# Altium schematic symbol library jlcpcb_2025_04_resistors_extended_1210.schlib: 2670 symbols (part 2 of 14) (continued)
## 1210W2F2611T5E (continued)

## 1210W2F2700T5E
designator R?  Resistance: 270Ω  (hidden comment: *)
Resistor, 270Ω, ±1%, 500mW, 200V, ±100ppm/℃, -55℃~+155℃, SMD 1210; Manufacturer: Uniroyal; Manufacturer Part Number: 1210W2F2700T5E; Supplier 1: LCSC; Supplier Part Number 1: C620671; JLCPCB Part Number: C620671; Power Rating: 500mW; Category: Resistors; Package Size: 1210; JLCPCB Basic Part: Yes; Tolerance: ±1%; Voltage Rating: 200V; Temperature Coefficient: ±100ppm/℃; Temperature Rating: -55℃~+155℃; ComponentLink1Description: Datasheet; ComponentLink1URL: https://wmsc.lcsc.com/wmsc/upload/file/pdf/v2/lcsc/2205311816_UNI-ROYAL-Uniroyal-Elec-1210W2F2700T5E_C620671.pdf; ComponentLink2Description: JLCPCB Part URL; ComponentLink2URL: https://jlcpcb.com/partdetail/C620671
pins: 1, 2
1 alternate drawing of the same symbol

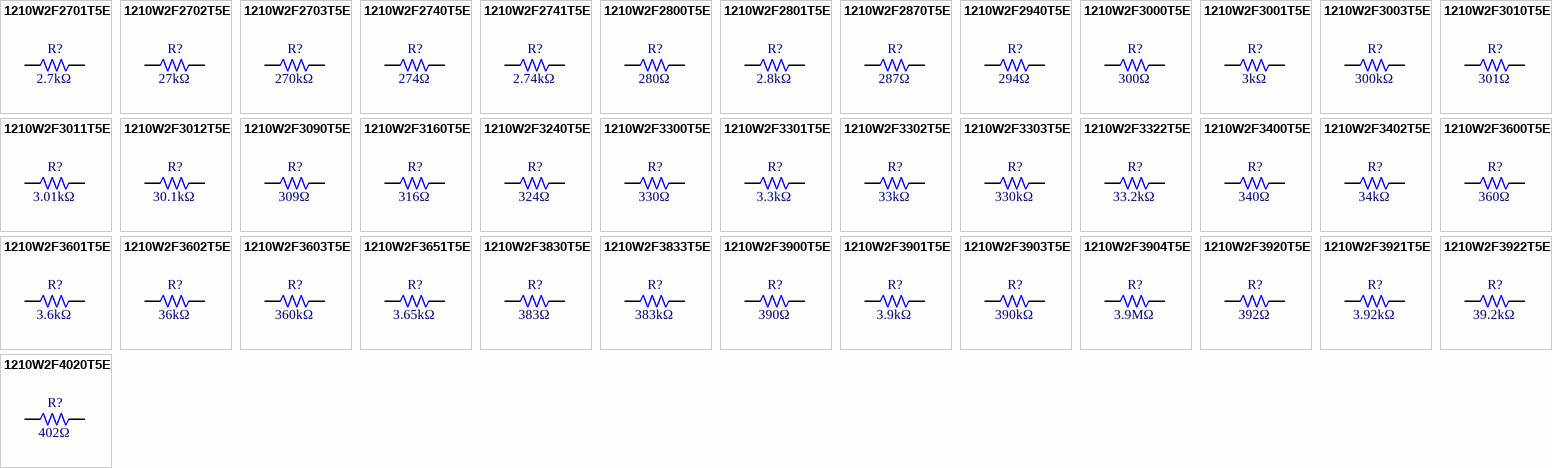
[diagram p6: symbols 1210W2F2701T5E to 1210W2F4020T5E]

## 1210W2F2701T5E
designator R?  Resistance: 2.7kΩ  (hidden comment: *)
Resistor, 2.7kΩ, ±1%, 500mW, 200V, ±100ppm/℃, -55℃~+155℃, SMD 1210; Manufacturer: Uniroyal; Manufacturer Part Number: 1210W2F2701T5E; Supplier 1: LCSC; Supplier Part Number 1: C422342; JLCPCB Part Number: C422342; Power Rating: 500mW; Category: Resistors; Package Size: 1210; JLCPCB Basic Part: Yes; Tolerance: ±1%; Voltage Rating: 200V; Temperature Coefficient: ±100ppm/℃; Temperature Rating: -55℃~+155℃; ComponentLink1Description: Datasheet; ComponentLink1URL: https://wmsc.lcsc.com/wmsc/upload/file/pdf/v2/lcsc/2205312016_UNI-ROYAL-Uniroyal-Elec-1210W2F2701T5E_C422342.pdf; ComponentLink2Description: JLCPCB Part URL; ComponentLink2URL: https://jlcpcb.com/partdetail/C422342
pins: 1, 2
1 alternate drawing of the same symbol

## 1210W2F2702T5E
designator R?  Resistance: 27kΩ  (hidden comment: *)
Resistor, 27kΩ, ±1%, 500mW, 200V, ±100ppm/℃, -55℃~+155℃, SMD 1210; Manufacturer: Uniroyal; Manufacturer Part Number: 1210W2F2702T5E; Supplier 1: LCSC; Supplier Part Number 1: C784290; JLCPCB Part Number: C784290; Power Rating: 500mW; Category: Resistors; Package Size: 1210; JLCPCB Basic Part: Yes; Tolerance: ±1%; Voltage Rating: 200V; Temperature Coefficient: ±100ppm/℃; Temperature Rating: -55℃~+155℃; ComponentLink1Description: Datasheet; ComponentLink1URL: https://wmsc.lcsc.com/wmsc/upload/file/pdf/v2/lcsc/2206011100_UNI-ROYAL-Uniroyal-Elec-1210W2F2702T5E_C784290.pdf; ComponentLink2Description: JLCPCB Part URL; ComponentLink2URL: https://jlcpcb.com/partdetail/C784290
pins: 1, 2
1 alternate drawing of the same symbol

## 1210W2F2703T5E
designator R?  Resistance: 270kΩ  (hidden comment: *)
Resistor, 270kΩ, ±1%, 500mW, 200V, ±100ppm/℃, -55℃~+155℃, SMD 1210; Manufacturer: Uniroyal; Manufacturer Part Number: 1210W2F2703T5E; Supplier 1: LCSC; Supplier Part Number 1: C407199; JLCPCB Part Number: C407199; Power Rating: 500mW; Category: Resistors; Package Size: 1210; JLCPCB Basic Part: Yes; Tolerance: ±1%; Voltage Rating: 200V; Temperature Coefficient: ±100ppm/℃; Temperature Rating: -55℃~+155℃; ComponentLink1Description: Datasheet; ComponentLink1URL: https://wmsc.lcsc.com/wmsc/upload/file/pdf/v2/lcsc/2205311945_UNI-ROYAL-Uniroyal-Elec-1210W2F2703T5E_C407199.pdf; ComponentLink2Description: JLCPCB Part URL; ComponentLink2URL: https://jlcpcb.com/partdetail/C407199
pins: 1, 2
1 alternate drawing of the same symbol

## 1210W2F2740T5E
designator R?  Resistance: 274Ω  (hidden comment: *)
Resistor, 274Ω, ±1%, 500mW, 200V, ±100ppm/℃, -55℃~+155℃, SMD 1210; Manufacturer: Uniroyal; Manufacturer Part Number: 1210W2F2740T5E; Supplier 1: LCSC; Supplier Part Number 1: C784291; JLCPCB Part Number: C784291; Power Rating: 500mW; Category: Resistors; Package Size: 1210; JLCPCB Basic Part: Yes; Tolerance: ±1%; Voltage Rating: 200V; Temperature Coefficient: ±100ppm/℃; Temperature Rating: -55℃~+155℃; ComponentLink1Description: Datasheet; ComponentLink1URL: https://wmsc.lcsc.com/wmsc/upload/file/pdf/v2/lcsc/2206011100_UNI-ROYAL-Uniroyal-Elec-1210W2F2740T5E_C784291.pdf; ComponentLink2Description: JLCPCB Part URL; ComponentLink2URL: https://jlcpcb.com/partdetail/C784291
pins: 1, 2
1 alternate drawing of the same symbol

## 1210W2F2741T5E
designator R?  Resistance: 2.74kΩ  (hidden comment: *)
Resistor, 2.74kΩ, ±1%, 500mW, 200V, ±100ppm/℃, -55℃~+155℃, SMD 1210; Manufacturer: Uniroyal; Manufacturer Part Number: 1210W2F2741T5E; Supplier 1: LCSC; Supplier Part Number 1: C407198; JLCPCB Part Number: C407198; Power Rating: 500mW; Category: Resistors; Package Size: 1210; JLCPCB Basic Part: Yes; Tolerance: ±1%; Voltage Rating: 200V; Temperature Coefficient: ±100ppm/℃; Temperature Rating: -55℃~+155℃; ComponentLink1Description: Datasheet; ComponentLink1URL: https://wmsc.lcsc.com/wmsc/upload/file/pdf/v2/lcsc/2205311945_UNI-ROYAL-Uniroyal-Elec-1210W2F2741T5E_C407198.pdf; ComponentLink2Description: JLCPCB Part URL; ComponentLink2URL: https://jlcpcb.com/partdetail/C407198
pins: 1, 2
1 alternate drawing of the same symbol

## 1210W2F2800T5E
designator R?  Resistance: 280Ω  (hidden comment: *)
Resistor, 280Ω, ±1%, 500mW, 200V, ±100ppm/℃, -55℃~+155℃, SMD 1210; Manufacturer: Uniroyal; Manufacturer Part Number: 1210W2F2800T5E; Supplier 1: LCSC; Supplier Part Number 1: C422339; JLCPCB Part Number: C422339; Power Rating: 500mW; Category: Resistors; Package Size: 1210; JLCPCB Basic Part: Yes; Tolerance: ±1%; Voltage Rating: 200V; Temperature Coefficient: ±100ppm/℃; Temperature Rating: -55℃~+155℃; ComponentLink1Description: Datasheet; ComponentLink1URL: https://wmsc.lcsc.com/wmsc/upload/file/pdf/v2/lcsc/2205312016_UNI-ROYAL-Uniroyal-Elec-1210W2F2800T5E_C422339.pdf; ComponentLink2Description: JLCPCB Part URL; ComponentLink2URL: https://jlcpcb.com/partdetail/C422339
pins: 1, 2
1 alternate drawing of the same symbol

## 1210W2F2801T5E
designator R?  Resistance: 2.8kΩ  (hidden comment: *)
Resistor, 2.8kΩ, ±1%, 500mW, 200V, ±100ppm/℃, -55℃~+155℃, SMD 1210; Manufacturer: Uniroyal; Manufacturer Part Number: 1210W2F2801T5E; Supplier 1: LCSC; Supplier Part Number 1: C422338; JLCPCB Part Number: C422338; Power Rating: 500mW; Category: Resistors; Package Size: 1210; JLCPCB Basic Part: Yes; Tolerance: ±1%; Voltage Rating: 200V; Temperature Coefficient: ±100ppm/℃; Temperature Rating: -55℃~+155℃; ComponentLink1Description: Datasheet; ComponentLink1URL: https://wmsc.lcsc.com/wmsc/upload/file/pdf/v2/lcsc/2205312016_UNI-ROYAL-Uniroyal-Elec-1210W2F2801T5E_C422338.pdf; ComponentLink2Description: JLCPCB Part URL; ComponentLink2URL: https://jlcpcb.com/partdetail/C422338
pins: 1, 2
1 alternate drawing of the same symbol

## 1210W2F2870T5E
designator R?  Resistance: 287Ω  (hidden comment: *)
Resistor, 287Ω, ±1%, 500mW, 200V, ±100ppm/℃, -55℃~+155℃, SMD 1210; Manufacturer: Uniroyal; Manufacturer Part Number: 1210W2F2870T5E; Supplier 1: LCSC; Supplier Part Number 1: C422334; JLCPCB Part Number: C422334; Power Rating: 500mW; Category: Resistors; Package Size: 1210; JLCPCB Basic Part: Yes; Tolerance: ±1%; Voltage Rating: 200V; Temperature Coefficient: ±100ppm/℃; Temperature Rating: -55℃~+155℃; ComponentLink1Description: Datasheet; ComponentLink1URL: https://wmsc.lcsc.com/wmsc/upload/file/pdf/v2/lcsc/2205312016_UNI-ROYAL-Uniroyal-Elec-1210W2F2870T5E_C422334.pdf; ComponentLink2Description: JLCPCB Part URL; ComponentLink2URL: https://jlcpcb.com/partdetail/C422334
pins: 1, 2
1 alternate drawing of the same symbol

## 1210W2F2940T5E
designator R?  Resistance: 294Ω  (hidden comment: *)
Resistor, 294Ω, ±1%, 500mW, 200V, ±100ppm/℃, -55℃~+155℃, SMD 1210; Manufacturer: Uniroyal; Manufacturer Part Number: 1210W2F2940T5E; Supplier 1: LCSC; Supplier Part Number 1: C784292; JLCPCB Part Number: C784292; Power Rating: 500mW; Category: Resistors; Package Size: 1210; JLCPCB Basic Part: Yes; Tolerance: ±1%; Voltage Rating: 200V; Temperature Coefficient: ±100ppm/℃; Temperature Rating: -55℃~+155℃; ComponentLink1Description: Datasheet; ComponentLink1URL: https://wmsc.lcsc.com/wmsc/upload/file/pdf/v2/lcsc/2206011100_UNI-ROYAL-Uniroyal-Elec-1210W2F2940T5E_C784292.pdf; ComponentLink2Description: JLCPCB Part URL; ComponentLink2URL: https://jlcpcb.com/partdetail/C784292
pins: 1, 2
1 alternate drawing of the same symbol

## 1210W2F3000T5E
designator R?  Resistance: 300Ω  (hidden comment: *)
Resistor, 300Ω, ±1%, 500mW, 200V, ±100ppm/℃, -55℃~+155℃, SMD 1210; Manufacturer: Uniroyal; Manufacturer Part Number: 1210W2F3000T5E; Supplier 1: LCSC; Supplier Part Number 1: C407196; JLCPCB Part Number: C407196; Power Rating: 500mW; Category: Resistors; Package Size: 1210; JLCPCB Basic Part: Yes; Tolerance: ±1%; Voltage Rating: 200V; Temperature Coefficient: ±100ppm/℃; Temperature Rating: -55℃~+155℃; ComponentLink1Description: Datasheet; ComponentLink1URL: https://wmsc.lcsc.com/wmsc/upload/file/pdf/v2/lcsc/2205311945_UNI-ROYAL-Uniroyal-Elec-1210W2F3000T5E_C407196.pdf; ComponentLink2Description: JLCPCB Part URL; ComponentLink2URL: https://jlcpcb.com/partdetail/C407196
pins: 1, 2
1 alternate drawing of the same symbol

## 1210W2F3001T5E
designator R?  Resistance: 3kΩ  (hidden comment: *)
Resistor, 3kΩ, ±1%, 500mW, 200V, ±100ppm/℃, -55℃~+155℃, SMD 1210; Manufacturer: Uniroyal; Manufacturer Part Number: 1210W2F3001T5E; Supplier 1: LCSC; Supplier Part Number 1: C422332; JLCPCB Part Number: C422332; Power Rating: 500mW; Category: Resistors; Package Size: 1210; JLCPCB Basic Part: Yes; Tolerance: ±1%; Voltage Rating: 200V; Temperature Coefficient: ±100ppm/℃; Temperature Rating: -55℃~+155℃; ComponentLink1Description: Datasheet; ComponentLink1URL: https://wmsc.lcsc.com/wmsc/upload/file/pdf/v2/lcsc/2205312016_UNI-ROYAL-Uniroyal-Elec-1210W2F3001T5E_C422332.pdf; ComponentLink2Description: JLCPCB Part URL; ComponentLink2URL: https://jlcpcb.com/partdetail/C422332
pins: 1, 2
1 alternate drawing of the same symbol

## 1210W2F3003T5E
designator R?  Resistance: 300kΩ  (hidden comment: *)
Resistor, 300kΩ, ±1%, 500mW, 200V, ±100ppm/℃, -55℃~+155℃, SMD 1210; Manufacturer: Uniroyal; Manufacturer Part Number: 1210W2F3003T5E; Supplier 1: LCSC; Supplier Part Number 1: C422330; JLCPCB Part Number: C422330; Power Rating: 500mW; Category: Resistors; Package Size: 1210; JLCPCB Basic Part: Yes; Tolerance: ±1%; Voltage Rating: 200V; Temperature Coefficient: ±100ppm/℃; Temperature Rating: -55℃~+155℃; ComponentLink1Description: Datasheet; ComponentLink1URL: https://wmsc.lcsc.com/wmsc/upload/file/pdf/v2/lcsc/2205312016_UNI-ROYAL-Uniroyal-Elec-1210W2F3003T5E_C422330.pdf; ComponentLink2Description: JLCPCB Part URL; ComponentLink2URL: https://jlcpcb.com/partdetail/C422330
pins: 1, 2
1 alternate drawing of the same symbol

## 1210W2F3010T5E
designator R?  Resistance: 301Ω  (hidden comment: *)
Resistor, 301Ω, ±1%, 500mW, 200V, ±100ppm/℃, -55℃~+155℃, SMD 1210; Manufacturer: Uniroyal; Manufacturer Part Number: 1210W2F3010T5E; Supplier 1: LCSC; Supplier Part Number 1: C784293; JLCPCB Part Number: C784293; Power Rating: 500mW; Category: Resistors; Package Size: 1210; JLCPCB Basic Part: Yes; Tolerance: ±1%; Voltage Rating: 200V; Temperature Coefficient: ±100ppm/℃; Temperature Rating: -55℃~+155℃; ComponentLink1Description: Datasheet; ComponentLink1URL: https://wmsc.lcsc.com/wmsc/upload/file/pdf/v2/lcsc/2206011100_UNI-ROYAL-Uniroyal-Elec-1210W2F3010T5E_C784293.pdf; ComponentLink2Description: JLCPCB Part URL; ComponentLink2URL: https://jlcpcb.com/partdetail/C784293
pins: 1, 2
1 alternate drawing of the same symbol

## 1210W2F3011T5E
designator R?  Resistance: 3.01kΩ  (hidden comment: *)
Resistor, 3.01kΩ, ±1%, 500mW, 200V, ±100ppm/℃, -55℃~+155℃, SMD 1210; Manufacturer: Uniroyal; Manufacturer Part Number: 1210W2F3011T5E; Supplier 1: LCSC; Supplier Part Number 1: C47115; JLCPCB Part Number: C47115; Power Rating: 500mW; Category: Resistors; Package Size: 1210; JLCPCB Basic Part: Yes; Tolerance: ±1%; Voltage Rating: 200V; Temperature Coefficient: ±100ppm/℃; Temperature Rating: -55℃~+155℃; ComponentLink1Description: Datasheet; ComponentLink1URL: https://wmsc.lcsc.com/wmsc/upload/file/pdf/v2/lcsc/2206010000_UNI-ROYAL-Uniroyal-Elec-1210W2F3011T5E_C47115.pdf; ComponentLink2Description: JLCPCB Part URL; ComponentLink2URL: https://jlcpcb.com/partdetail/C47115
pins: 1, 2
1 alternate drawing of the same symbol

## 1210W2F3012T5E
designator R?  Resistance: 30.1kΩ  (hidden comment: *)
Resistor, 30.1kΩ, ±1%, 500mW, 200V, ±100ppm/℃, -55℃~+155℃, SMD 1210; Manufacturer: Uniroyal; Manufacturer Part Number: 1210W2F3012T5E; Supplier 1: LCSC; Supplier Part Number 1: C422329; JLCPCB Part Number: C422329; Power Rating: 500mW; Category: Resistors; Package Size: 1210; JLCPCB Basic Part: Yes; Tolerance: ±1%; Voltage Rating: 200V; Temperature Coefficient: ±100ppm/℃; Temperature Rating: -55℃~+155℃; ComponentLink1Description: Datasheet; ComponentLink1URL: https://wmsc.lcsc.com/wmsc/upload/file/pdf/v2/lcsc/2205312016_UNI-ROYAL-Uniroyal-Elec-1210W2F3012T5E_C422329.pdf; ComponentLink2Description: JLCPCB Part URL; ComponentLink2URL: https://jlcpcb.com/partdetail/C422329
pins: 1, 2
1 alternate drawing of the same symbol

## 1210W2F3090T5E
designator R?  Resistance: 309Ω  (hidden comment: *)
Resistor, 309Ω, ±1%, 500mW, 200V, ±100ppm/℃, -55℃~+155℃, SMD 1210; Manufacturer: Uniroyal; Manufacturer Part Number: 1210W2F3090T5E; Supplier 1: LCSC; Supplier Part Number 1: C784294; JLCPCB Part Number: C784294; Power Rating: 500mW; Category: Resistors; Package Size: 1210; JLCPCB Basic Part: Yes; Tolerance: ±1%; Voltage Rating: 200V; Temperature Coefficient: ±100ppm/℃; Temperature Rating: -55℃~+155℃; ComponentLink1Description: Datasheet; ComponentLink1URL: https://wmsc.lcsc.com/wmsc/upload/file/pdf/v2/lcsc/2206011100_UNI-ROYAL-Uniroyal-Elec-1210W2F3090T5E_C784294.pdf; ComponentLink2Description: JLCPCB Part URL; ComponentLink2URL: https://jlcpcb.com/partdetail/C784294
pins: 1, 2
1 alternate drawing of the same symbol

## 1210W2F3160T5E
designator R?  Resistance: 316Ω  (hidden comment: *)
Resistor, 316Ω, ±1%, 500mW, 200V, ±100ppm/℃, -55℃~+155℃, SMD 1210; Manufacturer: Uniroyal; Manufacturer Part Number: 1210W2F3160T5E; Supplier 1: LCSC; Supplier Part Number 1: C784295; JLCPCB Part Number: C784295; Power Rating: 500mW; Category: Resistors; Package Size: 1210; JLCPCB Basic Part: Yes; Tolerance: ±1%; Voltage Rating: 200V; Temperature Coefficient: ±100ppm/℃; Temperature Rating: -55℃~+155℃; ComponentLink1Description: Datasheet; ComponentLink1URL: https://wmsc.lcsc.com/wmsc/upload/file/pdf/v2/lcsc/2206011100_UNI-ROYAL-Uniroyal-Elec-1210W2F3160T5E_C784295.pdf; ComponentLink2Description: JLCPCB Part URL; ComponentLink2URL: https://jlcpcb.com/partdetail/C784295
pins: 1, 2
1 alternate drawing of the same symbol

## 1210W2F3240T5E
designator R?  Resistance: 324Ω  (hidden comment: *)
Resistor, 324Ω, ±1%, 500mW, 200V, ±100ppm/℃, -55℃~+155℃, SMD 1210; Manufacturer: Uniroyal; Manufacturer Part Number: 1210W2F3240T5E; Supplier 1: LCSC; Supplier Part Number 1: C407194; JLCPCB Part Number: C407194; Power Rating: 500mW; Category: Resistors; Package Size: 1210; JLCPCB Basic Part: Yes; Tolerance: ±1%; Voltage Rating: 200V; Temperature Coefficient: ±100ppm/℃; Temperature Rating: -55℃~+155℃; ComponentLink1Description: Datasheet; ComponentLink1URL: https://wmsc.lcsc.com/wmsc/upload/file/pdf/v2/lcsc/2205311945_UNI-ROYAL-Uniroyal-Elec-1210W2F3240T5E_C407194.pdf; ComponentLink2Description: JLCPCB Part URL; ComponentLink2URL: https://jlcpcb.com/partdetail/C407194
pins: 1, 2
1 alternate drawing of the same symbol

## 1210W2F3300T5E
designator R?  Resistance: 330Ω  (hidden comment: *)
Resistor, 330Ω, ±1%, 500mW, 200V, ±100ppm/℃, -55℃~+155℃, SMD 1210; Manufacturer: Uniroyal; Manufacturer Part Number: 1210W2F3300T5E; Supplier 1: LCSC; Supplier Part Number 1: C422327; JLCPCB Part Number: C422327; Power Rating: 500mW; Category: Resistors; Package Size: 1210; JLCPCB Basic Part: Yes; Tolerance: ±1%; Voltage Rating: 200V; Temperature Coefficient: ±100ppm/℃; Temperature Rating: -55℃~+155℃; ComponentLink1Description: Datasheet; ComponentLink1URL: https://wmsc.lcsc.com/wmsc/upload/file/pdf/v2/lcsc/2205312016_UNI-ROYAL-Uniroyal-Elec-1210W2F3300T5E_C422327.pdf; ComponentLink2Description: JLCPCB Part URL; ComponentLink2URL: https://jlcpcb.com/partdetail/C422327
pins: 1, 2
1 alternate drawing of the same symbol

## 1210W2F3301T5E
designator R?  Resistance: 3.3kΩ  (hidden comment: *)
Resistor, 3.3kΩ, ±1%, 500mW, 200V, ±100ppm/℃, -55℃~+155℃, SMD 1210; Manufacturer: Uniroyal; Manufacturer Part Number: 1210W2F3301T5E; Supplier 1: LCSC; Supplier Part Number 1: C474221; JLCPCB Part Number: C474221; Power Rating: 500mW; Category: Resistors; Package Size: 1210; JLCPCB Basic Part: Yes; Tolerance: ±1%; Voltage Rating: 200V; Temperature Coefficient: ±100ppm/℃; Temperature Rating: -55℃~+155℃; ComponentLink1Description: Datasheet; ComponentLink1URL: https://wmsc.lcsc.com/wmsc/upload/file/pdf/v2/lcsc/2206011100_UNI-ROYAL-Uniroyal-Elec-1210W2F3301T5E_C474221.pdf; ComponentLink2Description: JLCPCB Part URL; ComponentLink2URL: https://jlcpcb.com/partdetail/C474221
pins: 1, 2
1 alternate drawing of the same symbol

## 1210W2F3302T5E
designator R?  Resistance: 33kΩ  (hidden comment: *)
Resistor, 33kΩ, ±1%, 500mW, 200V, ±100ppm/℃, -55℃~+155℃, SMD 1210; Manufacturer: Uniroyal; Manufacturer Part Number: 1210W2F3302T5E; Supplier 1: LCSC; Supplier Part Number 1: C270890; JLCPCB Part Number: C270890; Power Rating: 500mW; Category: Resistors; Package Size: 1210; JLCPCB Basic Part: Yes; Tolerance: ±1%; Voltage Rating: 200V; Temperature Coefficient: ±100ppm/℃; Temperature Rating: -55℃~+155℃; ComponentLink1Description: Datasheet; ComponentLink1URL: https://wmsc.lcsc.com/wmsc/upload/file/pdf/v2/lcsc/2205312300_UNI-ROYAL-Uniroyal-Elec-1210W2F3302T5E_C270890.pdf; ComponentLink2Description: JLCPCB Part URL; ComponentLink2URL: https://jlcpcb.com/partdetail/C270890
pins: 1, 2
1 alternate drawing of the same symbol

## 1210W2F3303T5E
designator R?  Resistance: 330kΩ  (hidden comment: *)
Resistor, 330kΩ, ±1%, 500mW, 200V, ±100ppm/℃, -55℃~+155℃, SMD 1210; Manufacturer: Uniroyal; Manufacturer Part Number: 1210W2F3303T5E; Supplier 1: LCSC; Supplier Part Number 1: C407193; JLCPCB Part Number: C407193; Power Rating: 500mW; Category: Resistors; Package Size: 1210; JLCPCB Basic Part: Yes; Tolerance: ±1%; Voltage Rating: 200V; Temperature Coefficient: ±100ppm/℃; Temperature Rating: -55℃~+155℃; ComponentLink1Description: Datasheet; ComponentLink1URL: https://wmsc.lcsc.com/wmsc/upload/file/pdf/v2/lcsc/2205311945_UNI-ROYAL-Uniroyal-Elec-1210W2F3303T5E_C407193.pdf; ComponentLink2Description: JLCPCB Part URL; ComponentLink2URL: https://jlcpcb.com/partdetail/C407193
pins: 1, 2
1 alternate drawing of the same symbol

## 1210W2F3322T5E
designator R?  Resistance: 33.2kΩ  (hidden comment: *)
Resistor, 33.2kΩ, ±1%, 500mW, 200V, ±100ppm/℃, -55℃~+155℃, SMD 1210; Manufacturer: Uniroyal; Manufacturer Part Number: 1210W2F3322T5E; Supplier 1: LCSC; Supplier Part Number 1: C422325; JLCPCB Part Number: C422325; Power Rating: 500mW; Category: Resistors; Package Size: 1210; JLCPCB Basic Part: Yes; Tolerance: ±1%; Voltage Rating: 200V; Temperature Coefficient: ±100ppm/℃; Temperature Rating: -55℃~+155℃; ComponentLink1Description: Datasheet; ComponentLink1URL: https://wmsc.lcsc.com/wmsc/upload/file/pdf/v2/lcsc/2205312016_UNI-ROYAL-Uniroyal-Elec-1210W2F3322T5E_C422325.pdf; ComponentLink2Description: JLCPCB Part URL; ComponentLink2URL: https://jlcpcb.com/partdetail/C422325
pins: 1, 2
1 alternate drawing of the same symbol

## 1210W2F3400T5E
designator R?  Resistance: 340Ω  (hidden comment: *)
Resistor, 340Ω, ±1%, 500mW, 200V, ±100ppm/℃, -55℃~+155℃, SMD 1210; Manufacturer: Uniroyal; Manufacturer Part Number: 1210W2F3400T5E; Supplier 1: LCSC; Supplier Part Number 1: C784296; JLCPCB Part Number: C784296; Power Rating: 500mW; Category: Resistors; Package Size: 1210; JLCPCB Basic Part: Yes; Tolerance: ±1%; Voltage Rating: 200V; Temperature Coefficient: ±100ppm/℃; Temperature Rating: -55℃~+155℃; ComponentLink1Description: Datasheet; ComponentLink1URL: https://wmsc.lcsc.com/wmsc/upload/file/pdf/v2/lcsc/2206011100_UNI-ROYAL-Uniroyal-Elec-1210W2F3400T5E_C784296.pdf; ComponentLink2Description: JLCPCB Part URL; ComponentLink2URL: https://jlcpcb.com/partdetail/C784296
pins: 1, 2
1 alternate drawing of the same symbol

## 1210W2F3402T5E
designator R?  Resistance: 34kΩ  (hidden comment: *)
Resistor, 34kΩ, ±1%, 500mW, 200V, ±100ppm/℃, -55℃~+155℃, SMD 1210; Manufacturer: Uniroyal; Manufacturer Part Number: 1210W2F3402T5E; Supplier 1: LCSC; Supplier Part Number 1: C407191; JLCPCB Part Number: C407191; Power Rating: 500mW; Category: Resistors; Package Size: 1210; JLCPCB Basic Part: Yes; Tolerance: ±1%; Voltage Rating: 200V; Temperature Coefficient: ±100ppm/℃; Temperature Rating: -55℃~+155℃; ComponentLink1Description: Datasheet; ComponentLink1URL: https://wmsc.lcsc.com/wmsc/upload/file/pdf/v2/lcsc/2205311945_UNI-ROYAL-Uniroyal-Elec-1210W2F3402T5E_C407191.pdf; ComponentLink2Description: JLCPCB Part URL; ComponentLink2URL: https://jlcpcb.com/partdetail/C407191
pins: 1, 2
1 alternate drawing of the same symbol

## 1210W2F3600T5E
designator R?  Resistance: 360Ω  (hidden comment: *)
Resistor, 360Ω, ±1%, 500mW, 200V, ±100ppm/℃, -55℃~+155℃, SMD 1210; Manufacturer: Uniroyal; Manufacturer Part Number: 1210W2F3600T5E; Supplier 1: LCSC; Supplier Part Number 1: C620680; JLCPCB Part Number: C620680; Power Rating: 500mW; Category: Resistors; Package Size: 1210; JLCPCB Basic Part: Yes; Tolerance: ±1%; Voltage Rating: 200V; Temperature Coefficient: ±100ppm/℃; Temperature Rating: -55℃~+155℃; ComponentLink1Description: Datasheet; ComponentLink1URL: https://wmsc.lcsc.com/wmsc/upload/file/pdf/v2/lcsc/2205311816_UNI-ROYAL-Uniroyal-Elec-1210W2F3600T5E_C620680.pdf; ComponentLink2Description: JLCPCB Part URL; ComponentLink2URL: https://jlcpcb.com/partdetail/C620680
pins: 1, 2
1 alternate drawing of the same symbol

## 1210W2F3601T5E
designator R?  Resistance: 3.6kΩ  (hidden comment: *)
Resistor, 3.6kΩ, ±1%, 500mW, 200V, ±100ppm/℃, -55℃~+155℃, SMD 1210; Manufacturer: Uniroyal; Manufacturer Part Number: 1210W2F3601T5E; Supplier 1: LCSC; Supplier Part Number 1: C65411; JLCPCB Part Number: C65411; Power Rating: 500mW; Category: Resistors; Package Size: 1210; JLCPCB Basic Part: Yes; Tolerance: ±1%; Voltage Rating: 200V; Temperature Coefficient: ±100ppm/℃; Temperature Rating: -55℃~+155℃; ComponentLink1Description: Datasheet; ComponentLink1URL: https://wmsc.lcsc.com/wmsc/upload/file/pdf/v2/lcsc/2205312345_UNI-ROYAL-Uniroyal-Elec-1210W2F3601T5E_C65411.pdf; ComponentLink2Description: JLCPCB Part URL; ComponentLink2URL: https://jlcpcb.com/partdetail/C65411
pins: 1, 2
1 alternate drawing of the same symbol

## 1210W2F3602T5E
designator R?  Resistance: 36kΩ  (hidden comment: *)
Resistor, 36kΩ, ±1%, 500mW, 200V, ±100ppm/℃, -55℃~+155℃, SMD 1210; Manufacturer: Uniroyal; Manufacturer Part Number: 1210W2F3602T5E; Supplier 1: LCSC; Supplier Part Number 1: C407189; JLCPCB Part Number: C407189; Power Rating: 500mW; Category: Resistors; Package Size: 1210; JLCPCB Basic Part: Yes; Tolerance: ±1%; Voltage Rating: 200V; Temperature Coefficient: ±100ppm/℃; Temperature Rating: -55℃~+155℃; ComponentLink1Description: Datasheet; ComponentLink1URL: https://wmsc.lcsc.com/wmsc/upload/file/pdf/v2/lcsc/2205311945_UNI-ROYAL-Uniroyal-Elec-1210W2F3602T5E_C407189.pdf; ComponentLink2Description: JLCPCB Part URL; ComponentLink2URL: https://jlcpcb.com/partdetail/C407189
pins: 1, 2
1 alternate drawing of the same symbol

## 1210W2F3603T5E
designator R?  Resistance: 360kΩ  (hidden comment: *)
Resistor, 360kΩ, ±1%, 500mW, 200V, ±100ppm/℃, -55℃~+155℃, SMD 1210; Manufacturer: Uniroyal; Manufacturer Part Number: 1210W2F3603T5E; Supplier 1: LCSC; Supplier Part Number 1: C407188; JLCPCB Part Number: C407188; Power Rating: 500mW; Category: Resistors; Package Size: 1210; JLCPCB Basic Part: Yes; Tolerance: ±1%; Voltage Rating: 200V; Temperature Coefficient: ±100ppm/℃; Temperature Rating: -55℃~+155℃; ComponentLink1Description: Datasheet; ComponentLink1URL: https://wmsc.lcsc.com/wmsc/upload/file/pdf/v2/lcsc/2205311945_UNI-ROYAL-Uniroyal-Elec-1210W2F3603T5E_C407188.pdf; ComponentLink2Description: JLCPCB Part URL; ComponentLink2URL: https://jlcpcb.com/partdetail/C407188
pins: 1, 2
1 alternate drawing of the same symbol

## 1210W2F3651T5E
designator R?  Resistance: 3.65kΩ  (hidden comment: *)
Resistor, 3.65kΩ, ±1%, 500mW, 200V, ±100ppm/℃, -55℃~+155℃, SMD 1210; Manufacturer: Uniroyal; Manufacturer Part Number: 1210W2F3651T5E; Supplier 1: LCSC; Supplier Part Number 1: C407187; JLCPCB Part Number: C407187; Power Rating: 500mW; Category: Resistors; Package Size: 1210; JLCPCB Basic Part: Yes; Tolerance: ±1%; Voltage Rating: 200V; Temperature Coefficient: ±100ppm/℃; Temperature Rating: -55℃~+155℃; ComponentLink1Description: Datasheet; ComponentLink1URL: https://wmsc.lcsc.com/wmsc/upload/file/pdf/v2/lcsc/2205312300_UNI-ROYAL-Uniroyal-Elec-1210W2F3651T5E_C407187.pdf; ComponentLink2Description: JLCPCB Part URL; ComponentLink2URL: https://jlcpcb.com/partdetail/C407187
pins: 1, 2
1 alternate drawing of the same symbol

## 1210W2F3830T5E
designator R?  Resistance: 383Ω  (hidden comment: *)
Resistor, 383Ω, ±1%, 500mW, 200V, ±100ppm/℃, -55℃~+155℃, SMD 1210; Manufacturer: Uniroyal; Manufacturer Part Number: 1210W2F3830T5E; Supplier 1: LCSC; Supplier Part Number 1: C422314; JLCPCB Part Number: C422314; Power Rating: 500mW; Category: Resistors; Package Size: 1210; JLCPCB Basic Part: Yes; Tolerance: ±1%; Voltage Rating: 200V; Temperature Coefficient: ±100ppm/℃; Temperature Rating: -55℃~+155℃; ComponentLink1Description: Datasheet; ComponentLink1URL: https://wmsc.lcsc.com/wmsc/upload/file/pdf/v2/lcsc/2205312016_UNI-ROYAL-Uniroyal-Elec-1210W2F3830T5E_C422314.pdf; ComponentLink2Description: JLCPCB Part URL; ComponentLink2URL: https://jlcpcb.com/partdetail/C422314
pins: 1, 2
1 alternate drawing of the same symbol

## 1210W2F3833T5E
designator R?  Resistance: 383kΩ  (hidden comment: *)
Resistor, 383kΩ, ±1%, 500mW, 200V, ±100ppm/℃, -55℃~+155℃, SMD 1210; Manufacturer: Uniroyal; Manufacturer Part Number: 1210W2F3833T5E; Supplier 1: LCSC; Supplier Part Number 1: C422312; JLCPCB Part Number: C422312; Power Rating: 500mW; Category: Resistors; Package Size: 1210; JLCPCB Basic Part: Yes; Tolerance: ±1%; Voltage Rating: 200V; Temperature Coefficient: ±100ppm/℃; Temperature Rating: -55℃~+155℃; ComponentLink1Description: Datasheet; ComponentLink1URL: https://wmsc.lcsc.com/wmsc/upload/file/pdf/v2/lcsc/2205312016_UNI-ROYAL-Uniroyal-Elec-1210W2F3833T5E_C422312.pdf; ComponentLink2Description: JLCPCB Part URL; ComponentLink2URL: https://jlcpcb.com/partdetail/C422312
pins: 1, 2
1 alternate drawing of the same symbol

## 1210W2F3900T5E
designator R?  Resistance: 390Ω  (hidden comment: *)
Resistor, 390Ω, ±1%, 500mW, 200V, ±100ppm/℃, -55℃~+155℃, SMD 1210; Manufacturer: Uniroyal; Manufacturer Part Number: 1210W2F3900T5E; Supplier 1: LCSC; Supplier Part Number 1: C122364; JLCPCB Part Number: C122364; Power Rating: 500mW; Category: Resistors; Package Size: 1210; JLCPCB Basic Part: Yes; Tolerance: ±1%; Voltage Rating: 200V; Temperature Coefficient: ±100ppm/℃; Temperature Rating: -55℃~+155℃; ComponentLink1Description: Datasheet; ComponentLink1URL: https://wmsc.lcsc.com/wmsc/upload/file/pdf/v2/lcsc/2205312316_UNI-ROYAL-Uniroyal-Elec-1210W2F3900T5E_C122364.pdf; ComponentLink2Description: JLCPCB Part URL; ComponentLink2URL: https://jlcpcb.com/partdetail/C122364
pins: 1, 2
1 alternate drawing of the same symbol

## 1210W2F3901T5E
designator R?  Resistance: 3.9kΩ  (hidden comment: *)
Resistor, 3.9kΩ, ±1%, 500mW, 200V, ±100ppm/℃, -55℃~+155℃, SMD 1210; Manufacturer: Uniroyal; Manufacturer Part Number: 1210W2F3901T5E; Supplier 1: LCSC; Supplier Part Number 1: C620677; JLCPCB Part Number: C620677; Power Rating: 500mW; Category: Resistors; Package Size: 1210; JLCPCB Basic Part: Yes; Tolerance: ±1%; Voltage Rating: 200V; Temperature Coefficient: ±100ppm/℃; Temperature Rating: -55℃~+155℃; ComponentLink1Description: Datasheet; ComponentLink1URL: https://wmsc.lcsc.com/wmsc/upload/file/pdf/v2/lcsc/2205311816_UNI-ROYAL-Uniroyal-Elec-1210W2F3901T5E_C620677.pdf; ComponentLink2Description: JLCPCB Part URL; ComponentLink2URL: https://jlcpcb.com/partdetail/C620677
pins: 1, 2
1 alternate drawing of the same symbol

## 1210W2F3903T5E
designator R?  Resistance: 390kΩ  (hidden comment: *)
Resistor, 390kΩ, ±1%, 500mW, 200V, ±100ppm/℃, -55℃~+155℃, SMD 1210; Manufacturer: Uniroyal; Manufacturer Part Number: 1210W2F3903T5E; Supplier 1: LCSC; Supplier Part Number 1: C422311; JLCPCB Part Number: C422311; Power Rating: 500mW; Category: Resistors; Package Size: 1210; JLCPCB Basic Part: Yes; Tolerance: ±1%; Voltage Rating: 200V; Temperature Coefficient: ±100ppm/℃; Temperature Rating: -55℃~+155℃; ComponentLink1Description: Datasheet; ComponentLink1URL: https://wmsc.lcsc.com/wmsc/upload/file/pdf/v2/lcsc/2205312016_UNI-ROYAL-Uniroyal-Elec-1210W2F3903T5E_C422311.pdf; ComponentLink2Description: JLCPCB Part URL; ComponentLink2URL: https://jlcpcb.com/partdetail/C422311
pins: 1, 2
1 alternate drawing of the same symbol

## 1210W2F3904T5E
designator R?  Resistance: 3.9MΩ  (hidden comment: *)
Resistor, 3.9MΩ, ±1%, 500mW, 200V, ±100ppm/℃, -55℃~+155℃, SMD 1210; Manufacturer: Uniroyal; Manufacturer Part Number: 1210W2F3904T5E; Supplier 1: LCSC; Supplier Part Number 1: C407185; JLCPCB Part Number: C407185; Power Rating: 500mW; Category: Resistors; Package Size: 1210; JLCPCB Basic Part: Yes; Tolerance: ±1%; Voltage Rating: 200V; Temperature Coefficient: ±100ppm/℃; Temperature Rating: -55℃~+155℃; ComponentLink1Description: Datasheet; ComponentLink1URL: https://wmsc.lcsc.com/wmsc/upload/file/pdf/v2/lcsc/2205312300_UNI-ROYAL-Uniroyal-Elec-1210W2F3904T5E_C407185.pdf; ComponentLink2Description: JLCPCB Part URL; ComponentLink2URL: https://jlcpcb.com/partdetail/C407185
pins: 1, 2
1 alternate drawing of the same symbol

## 1210W2F3920T5E
designator R?  Resistance: 392Ω  (hidden comment: *)
Resistor, 392Ω, ±1%, 500mW, 200V, ±100ppm/℃, -55℃~+155℃, SMD 1210; Manufacturer: Uniroyal; Manufacturer Part Number: 1210W2F3920T5E; Supplier 1: LCSC; Supplier Part Number 1: C407184; JLCPCB Part Number: C407184; Power Rating: 500mW; Category: Resistors; Package Size: 1210; JLCPCB Basic Part: Yes; Tolerance: ±1%; Voltage Rating: 200V; Temperature Coefficient: ±100ppm/℃; Temperature Rating: -55℃~+155℃; ComponentLink1Description: Datasheet; ComponentLink1URL: https://wmsc.lcsc.com/wmsc/upload/file/pdf/v2/lcsc/2205312300_UNI-ROYAL-Uniroyal-Elec-1210W2F3920T5E_C407184.pdf; ComponentLink2Description: JLCPCB Part URL; ComponentLink2URL: https://jlcpcb.com/partdetail/C407184
pins: 1, 2
1 alternate drawing of the same symbol

## 1210W2F3921T5E
designator R?  Resistance: 3.92kΩ  (hidden comment: *)
Resistor, 3.92kΩ, ±1%, 500mW, 200V, ±100ppm/℃, -55℃~+155℃, SMD 1210; Manufacturer: Uniroyal; Manufacturer Part Number: 1210W2F3921T5E; Supplier 1: LCSC; Supplier Part Number 1: C422309; JLCPCB Part Number: C422309; Power Rating: 500mW; Category: Resistors; Package Size: 1210; JLCPCB Basic Part: Yes; Tolerance: ±1%; Voltage Rating: 200V; Temperature Coefficient: ±100ppm/℃; Temperature Rating: -55℃~+155℃; ComponentLink1Description: Datasheet; ComponentLink1URL: https://wmsc.lcsc.com/wmsc/upload/file/pdf/v2/lcsc/2205312016_UNI-ROYAL-Uniroyal-Elec-1210W2F3921T5E_C422309.pdf; ComponentLink2Description: JLCPCB Part URL; ComponentLink2URL: https://jlcpcb.com/partdetail/C422309
pins: 1, 2
1 alternate drawing of the same symbol

## 1210W2F3922T5E
designator R?  Resistance: 39.2kΩ  (hidden comment: *)
Resistor, 39.2kΩ, ±1%, 500mW, 200V, ±100ppm/℃, -55℃~+155℃, SMD 1210; Manufacturer: Uniroyal; Manufacturer Part Number: 1210W2F3922T5E; Supplier 1: LCSC; Supplier Part Number 1: C422308; JLCPCB Part Number: C422308; Power Rating: 500mW; Category: Resistors; Package Size: 1210; JLCPCB Basic Part: Yes; Tolerance: ±1%; Voltage Rating: 200V; Temperature Coefficient: ±100ppm/℃; Temperature Rating: -55℃~+155℃; ComponentLink1Description: Datasheet; ComponentLink1URL: https://wmsc.lcsc.com/wmsc/upload/file/pdf/v2/lcsc/2205312016_UNI-ROYAL-Uniroyal-Elec-1210W2F3922T5E_C422308.pdf; ComponentLink2Description: JLCPCB Part URL; ComponentLink2URL: https://jlcpcb.com/partdetail/C422308
pins: 1, 2
1 alternate drawing of the same symbol

## 1210W2F4020T5E
designator R?  Resistance: 402Ω  (hidden comment: *)
Resistor, 402Ω, ±1%, 500mW, 200V, ±100ppm/℃, -55℃~+155℃, SMD 1210; Manufacturer: Uniroyal; Manufacturer Part Number: 1210W2F4020T5E; Supplier 1: LCSC; Supplier Part Number 1: C784298; JLCPCB Part Number: C784298; Power Rating: 500mW; Category: Resistors; Package Size: 1210; JLCPCB Basic Part: Yes; Tolerance: ±1%; Voltage Rating: 200V; Temperature Coefficient: ±100ppm/℃; Temperature Rating: -55℃~+155℃; ComponentLink1Description: Datasheet; ComponentLink1URL: https://wmsc.lcsc.com/wmsc/upload/file/pdf/v2/lcsc/2206011045_UNI-ROYAL-Uniroyal-Elec-1210W2F4020T5E_C784298.pdf; ComponentLink2Description: JLCPCB Part URL; ComponentLink2URL: https://jlcpcb.com/partdetail/C784298
pins: 1, 2
1 alternate drawing of the same symbol

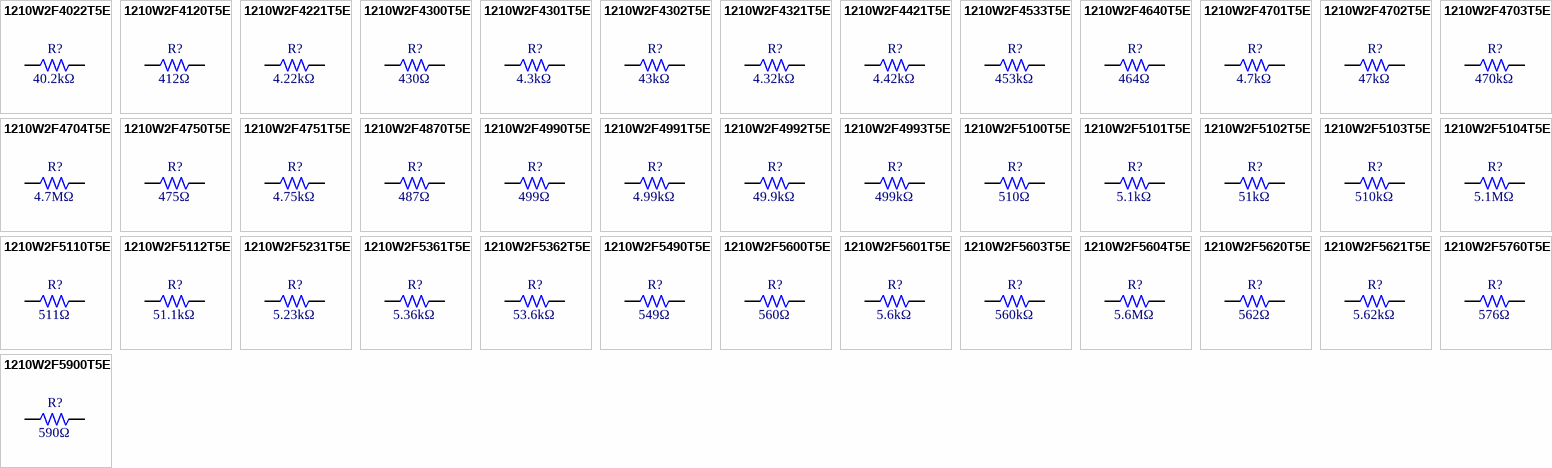
[diagram p7: symbols 1210W2F4022T5E to 1210W2F5900T5E]

## 1210W2F4022T5E
designator R?  Resistance: 40.2kΩ  (hidden comment: *)
Resistor, 40.2kΩ, ±1%, 500mW, 200V, ±100ppm/℃, -55℃~+155℃, SMD 1210; Manufacturer: Uniroyal; Manufacturer Part Number: 1210W2F4022T5E; Supplier 1: LCSC; Supplier Part Number 1: C422306; JLCPCB Part Number: C422306; Power Rating: 500mW; Category: Resistors; Package Size: 1210; JLCPCB Basic Part: Yes; Tolerance: ±1%; Voltage Rating: 200V; Temperature Coefficient: ±100ppm/℃; Temperature Rating: -55℃~+155℃; ComponentLink1Description: Datasheet; ComponentLink1URL: https://wmsc.lcsc.com/wmsc/upload/file/pdf/v2/lcsc/2205312016_UNI-ROYAL-Uniroyal-Elec-1210W2F4022T5E_C422306.pdf; ComponentLink2Description: JLCPCB Part URL; ComponentLink2URL: https://jlcpcb.com/partdetail/C422306
pins: 1, 2
1 alternate drawing of the same symbol

## 1210W2F4120T5E
designator R?  Resistance: 412Ω  (hidden comment: *)
Resistor, 412Ω, ±1%, 500mW, 200V, ±100ppm/℃, -55℃~+155℃, SMD 1210; Manufacturer: Uniroyal; Manufacturer Part Number: 1210W2F4120T5E; Supplier 1: LCSC; Supplier Part Number 1: C422304; JLCPCB Part Number: C422304; Power Rating: 500mW; Category: Resistors; Package Size: 1210; JLCPCB Basic Part: Yes; Tolerance: ±1%; Voltage Rating: 200V; Temperature Coefficient: ±100ppm/℃; Temperature Rating: -55℃~+155℃; ComponentLink1Description: Datasheet; ComponentLink1URL: https://wmsc.lcsc.com/wmsc/upload/file/pdf/v2/lcsc/2205312016_UNI-ROYAL-Uniroyal-Elec-1210W2F4120T5E_C422304.pdf; ComponentLink2Description: JLCPCB Part URL; ComponentLink2URL: https://jlcpcb.com/partdetail/C422304
pins: 1, 2
1 alternate drawing of the same symbol

## 1210W2F4221T5E
designator R?  Resistance: 4.22kΩ  (hidden comment: *)
Resistor, 4.22kΩ, ±1%, 500mW, 200V, ±100ppm/℃, -55℃~+155℃, SMD 1210; Manufacturer: Uniroyal; Manufacturer Part Number: 1210W2F4221T5E; Supplier 1: LCSC; Supplier Part Number 1: C422301; JLCPCB Part Number: C422301; Power Rating: 500mW; Category: Resistors; Package Size: 1210; JLCPCB Basic Part: Yes; Tolerance: ±1%; Voltage Rating: 200V; Temperature Coefficient: ±100ppm/℃; Temperature Rating: -55℃~+155℃; ComponentLink1Description: Datasheet; ComponentLink1URL: https://wmsc.lcsc.com/wmsc/upload/file/pdf/v2/lcsc/2205312016_UNI-ROYAL-Uniroyal-Elec-1210W2F4221T5E_C422301.pdf; ComponentLink2Description: JLCPCB Part URL; ComponentLink2URL: https://jlcpcb.com/partdetail/C422301
pins: 1, 2
1 alternate drawing of the same symbol

## 1210W2F4300T5E
designator R?  Resistance: 430Ω  (hidden comment: *)
Resistor, 430Ω, ±1%, 500mW, 200V, ±100ppm/℃, -55℃~+155℃, SMD 1210; Manufacturer: Uniroyal; Manufacturer Part Number: 1210W2F4300T5E; Supplier 1: LCSC; Supplier Part Number 1: C620682; JLCPCB Part Number: C620682; Power Rating: 500mW; Category: Resistors; Package Size: 1210; JLCPCB Basic Part: Yes; Tolerance: ±1%; Voltage Rating: 200V; Temperature Coefficient: ±100ppm/℃; Temperature Rating: -55℃~+155℃; ComponentLink1Description: Datasheet; ComponentLink1URL: https://wmsc.lcsc.com/wmsc/upload/file/pdf/v2/lcsc/2205311816_UNI-ROYAL-Uniroyal-Elec-1210W2F4300T5E_C620682.pdf; ComponentLink2Description: JLCPCB Part URL; ComponentLink2URL: https://jlcpcb.com/partdetail/C620682
pins: 1, 2
1 alternate drawing of the same symbol
